# Altium schematic symbol library jlcpcb_2025_04_capacitors_extended_0402.schlib: 3594 symbols (part 3 of 20)
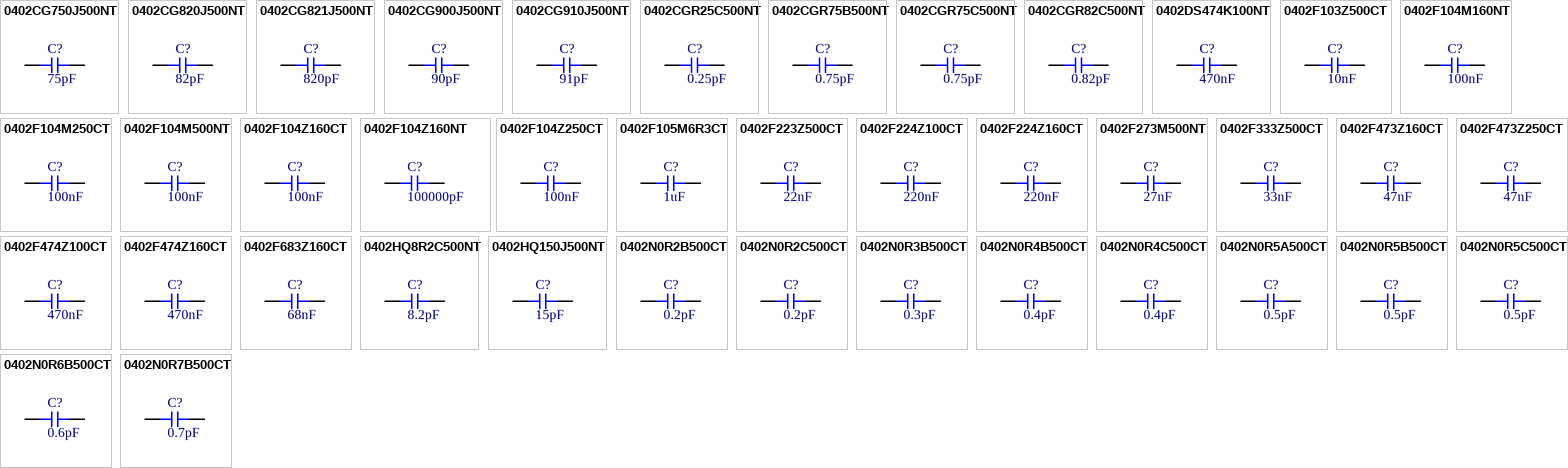
[diagram p91: symbols 0402CG750J500NT to 0402N0R7B500CT]

## 0402N0R6B500CT
designator C?  Capacitance: 0.6pF  (hidden comment: *)
Capacitor, Ceramic (MLCC), 0.6pF, 50V, NP0, SMD 0402; Manufacturer: Walsin Tech Corp; Manufacturer Part Number: 0402N0R6B500CT; Package Size: 0402; JLCPCB Basic Part: No; JLCPCB Part Number: C555387; Supplier 1: LCSC; Category: Capacitors - MLCC; Supplier Part Number 1: C555387; Voltage Rating: 50V; Temperature Coefficient: NP0; RoHS: Yes; ComponentLink1Description: Datasheet; ComponentLink1URL: https://wmsc.lcsc.com/wmsc/upload/file/pdf/v2/lcsc/2304140030_Walsin-Tech-Corp-0402N0R6B500CT_C555387.pdf; ComponentLink2Description: JLCPCB Part URL; ComponentLink2URL: https://jlcpcb.com/partdetail/C555387; ComponentLink3Description: LCSC Part URL; ComponentLink3URL: https://lcsc.com/product-detail/Multilayer-Ceramic-Capacitors-MLCC---SMD-SMT_Walsin-Tech-Corp-Walsin-Tech-Corp-0402N0R6B500CT_C555387.html
footprint CAP-0402 (0402 (1005M) Capacitor)
pins: 1, 2

## 0402N0R7B500CT
designator C?  Capacitance: 0.7pF  (hidden comment: *)
Capacitor, Ceramic (MLCC), 0.7pF, 50V, NP0, SMD 0402; Manufacturer: Walsin Tech Corp; Manufacturer Part Number: 0402N0R7B500CT; Package Size: 0402; JLCPCB Basic Part: No; JLCPCB Part Number: C2894185; Supplier 1: LCSC; Category: Capacitors - MLCC; Supplier Part Number 1: C2894185; Voltage Rating: 50V; Temperature Coefficient: NP0; RoHS: Yes; ComponentLink1Description: Datasheet; ComponentLink1URL: https://wmsc.lcsc.com/wmsc/upload/file/pdf/v2/lcsc/2109081830_Walsin-Tech-Corp-0402N0R7B500CT_C2894185.pdf; ComponentLink2Description: JLCPCB Part URL; ComponentLink2URL: https://jlcpcb.com/partdetail/C2894185; ComponentLink3Description: LCSC Part URL; ComponentLink3URL: https://lcsc.com/product-detail/Multilayer-Ceramic-Capacitors-MLCC---SMD-SMT_Walsin-Tech-Corp-Walsin-Tech-Corp-0402N0R7B500CT_C2894185.html
footprint CAP-0402 (0402 (1005M) Capacitor)
pins: 1, 2

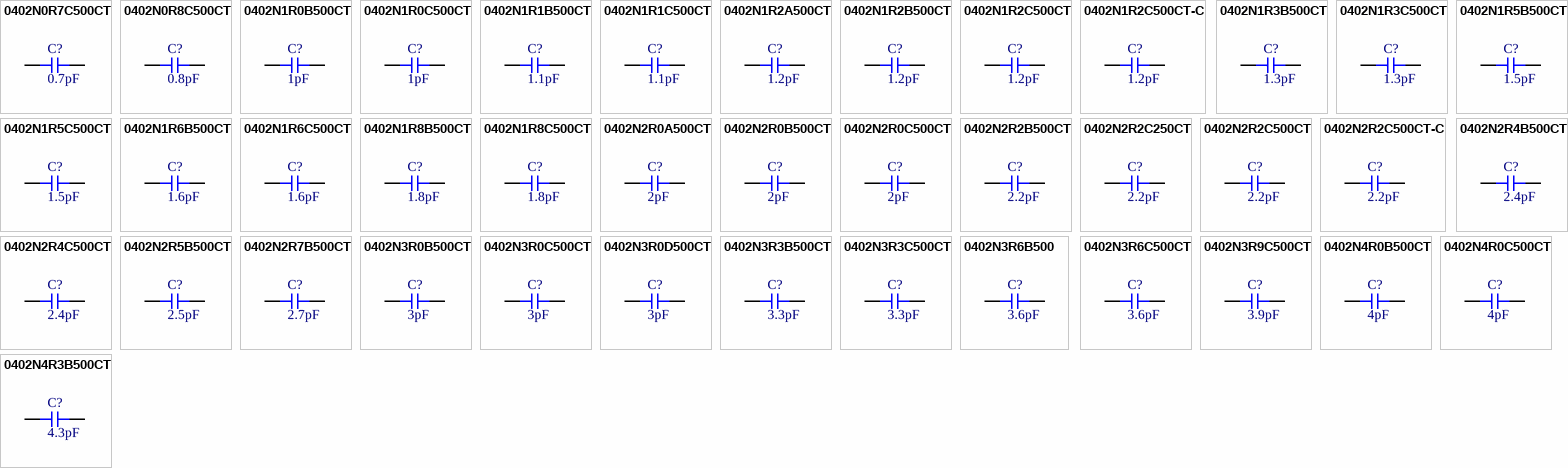
[diagram p9: symbols 0402N0R7C500CT to 0402N4R3B500CT]

## 0402N0R7C500CT
designator C?  Capacitance: 0.7pF  (hidden comment: *)
Capacitor, Ceramic (MLCC), 0.7pF, 50V, NP0, SMD 0402; Manufacturer: Walsin Tech Corp; Manufacturer Part Number: 0402N0R7C500CT; Package Size: 0402; JLCPCB Basic Part: No; JLCPCB Part Number: C2909410; Supplier 1: LCSC; Category: Capacitors - MLCC; Supplier Part Number 1: C2909410; Voltage Rating: 50V; Temperature Coefficient: NP0; RoHS: Yes; ComponentLink1Description: Datasheet; ComponentLink1URL: https://wmsc.lcsc.com/wmsc/upload/file/pdf/v2/lcsc/2110272130_Walsin-Tech-Corp-0402N0R7C500CT_C2909410.pdf; ComponentLink2Description: JLCPCB Part URL; ComponentLink2URL: https://jlcpcb.com/partdetail/C2909410; ComponentLink3Description: LCSC Part URL; ComponentLink3URL: https://lcsc.com/product-detail/Multilayer-Ceramic-Capacitors-MLCC---SMD-SMT_Walsin-Tech-Corp-Walsin-Tech-Corp-0402N0R7C500CT_C2909410.html
footprint CAP-0402 (0402 (1005M) Capacitor)
pins: 1, 2

## 0402N0R8C500CT
designator C?  Capacitance: 0.8pF  (hidden comment: *)
Capacitor, Ceramic (MLCC), 0.8pF, 50V, NP0, SMD 0402; Manufacturer: Walsin Tech Corp; Manufacturer Part Number: 0402N0R8C500CT; Package Size: 0402; JLCPCB Basic Part: No; JLCPCB Part Number: C387965; Supplier 1: LCSC; Category: Capacitors - MLCC; Supplier Part Number 1: C387965; Voltage Rating: 50V; Temperature Coefficient: NP0; RoHS: Yes; ComponentLink1Description: Datasheet; ComponentLink1URL: https://wmsc.lcsc.com/wmsc/upload/file/pdf/v2/lcsc/2304140030_Walsin-Tech-Corp-0402N0R8C500CT_C387965.pdf; ComponentLink2Description: JLCPCB Part URL; ComponentLink2URL: https://jlcpcb.com/partdetail/C387965; ComponentLink3Description: LCSC Part URL; ComponentLink3URL: https://lcsc.com/product-detail/Multilayer-Ceramic-Capacitors-MLCC---SMD-SMT_Walsin-Tech-Corp-Walsin-Tech-Corp-0402N0R8C500CT_C387965.html
footprint CAP-0402 (0402 (1005M) Capacitor)
pins: 1, 2

## 0402N1R0B500CT
designator C?  Capacitance: 1pF  (hidden comment: *)
Capacitor, Ceramic (MLCC), 1pF, 50V, NP0, SMD 0402; Manufacturer: Walsin Tech Corp; Manufacturer Part Number: 0402N1R0B500CT; Package Size: 0402; JLCPCB Basic Part: No; JLCPCB Part Number: C301966; Supplier 1: LCSC; Category: Capacitors - MLCC; Supplier Part Number 1: C301966; Voltage Rating: 50V; Temperature Coefficient: NP0; RoHS: Yes; ComponentLink1Description: Datasheet; ComponentLink1URL: https://wmsc.lcsc.com/wmsc/upload/file/pdf/v2/lcsc/2304140030_Walsin-Tech-Corp-0402N1R0B500CT_C301966.pdf; ComponentLink2Description: JLCPCB Part URL; ComponentLink2URL: https://jlcpcb.com/partdetail/C301966; ComponentLink3Description: LCSC Part URL; ComponentLink3URL: https://lcsc.com/product-detail/Multilayer-Ceramic-Capacitors-MLCC---SMD-SMT_Walsin-Tech-Corp-Walsin-Tech-Corp-0402N1R0B500CT_C301966.html
footprint CAP-0402 (0402 (1005M) Capacitor)
pins: 1, 2

## 0402N1R0C500CT
designator C?  Capacitance: 1pF  (hidden comment: *)
Capacitor, Ceramic (MLCC), 1pF, 50V, NP0, SMD 0402; Manufacturer: Walsin Tech Corp; Manufacturer Part Number: 0402N1R0C500CT; Package Size: 0402; JLCPCB Basic Part: No; JLCPCB Part Number: C123461; Supplier 1: LCSC; Category: Capacitors - MLCC; Supplier Part Number 1: C123461; Voltage Rating: 50V; Temperature Coefficient: NP0; RoHS: Yes; ComponentLink1Description: Datasheet; ComponentLink1URL: https://wmsc.lcsc.com/wmsc/upload/file/pdf/v2/lcsc/2304140030_Walsin-Tech-Corp-0402N1R0C500CT_C123461.pdf; ComponentLink2Description: JLCPCB Part URL; ComponentLink2URL: https://jlcpcb.com/partdetail/C123461; ComponentLink3Description: LCSC Part URL; ComponentLink3URL: https://lcsc.com/product-detail/Multilayer-Ceramic-Capacitors-MLCC---SMD-SMT_Walsin-Tech-Corp-Walsin-Tech-Corp-0402N1R0C500CT_C123461.html
footprint CAP-0402 (0402 (1005M) Capacitor)
pins: 1, 2

## 0402N1R1B500CT
designator C?  Capacitance: 1.1pF  (hidden comment: *)
Capacitor, Ceramic (MLCC), 1.1pF, 50V, NP0, SMD 0402; Manufacturer: Walsin Tech Corp; Manufacturer Part Number: 0402N1R1B500CT; Package Size: 0402; JLCPCB Basic Part: No; JLCPCB Part Number: C2918539; Supplier 1: LCSC; Category: Capacitors - MLCC; Supplier Part Number 1: C2918539; Voltage Rating: 50V; Temperature Coefficient: NP0; RoHS: Yes; ComponentLink1Description: Datasheet; ComponentLink1URL: https://wmsc.lcsc.com/wmsc/upload/file/pdf/v2/lcsc/2111171830_Walsin-Tech-Corp-0402N1R1B500CT_C2918539.pdf; ComponentLink2Description: JLCPCB Part URL; ComponentLink2URL: https://jlcpcb.com/partdetail/C2918539; ComponentLink3Description: LCSC Part URL; ComponentLink3URL: https://lcsc.com/product-detail/Multilayer-Ceramic-Capacitors-MLCC---SMD-SMT_Walsin-Tech-Corp-Walsin-Tech-Corp-0402N1R1B500CT_C2918539.html
footprint CAP-0402 (0402 (1005M) Capacitor)
pins: 1, 2

## 0402N1R1C500CT
designator C?  Capacitance: 1.1pF  (hidden comment: *)
Capacitor, Ceramic (MLCC), 1.1pF, 50V, NP0, SMD 0402; Manufacturer: Walsin Tech Corp; Manufacturer Part Number: 0402N1R1C500CT; Package Size: 0402; JLCPCB Basic Part: No; JLCPCB Part Number: C387974; Supplier 1: LCSC; Category: Capacitors - MLCC; Supplier Part Number 1: C387974; Voltage Rating: 50V; Temperature Coefficient: NP0; RoHS: Yes; ComponentLink1Description: Datasheet; ComponentLink1URL: https://wmsc.lcsc.com/wmsc/upload/file/pdf/v2/lcsc/2304140030_Walsin-Tech-Corp-0402N1R1C500CT_C387974.pdf; ComponentLink2Description: JLCPCB Part URL; ComponentLink2URL: https://jlcpcb.com/partdetail/C387974; ComponentLink3Description: LCSC Part URL; ComponentLink3URL: https://lcsc.com/product-detail/Multilayer-Ceramic-Capacitors-MLCC---SMD-SMT_Walsin-Tech-Corp-Walsin-Tech-Corp-0402N1R1C500CT_C387974.html
footprint CAP-0402 (0402 (1005M) Capacitor)
pins: 1, 2

## 0402N1R2A500CT
designator C?  Capacitance: 1.2pF  (hidden comment: *)
Capacitor, Ceramic (MLCC), 1.2pF, 50V, NP0, SMD 0402; Manufacturer: Walsin Tech Corp; Manufacturer Part Number: 0402N1R2A500CT; Package Size: 0402; JLCPCB Basic Part: No; JLCPCB Part Number: C296011; Supplier 1: LCSC; Category: Capacitors - MLCC; Supplier Part Number 1: C296011; Voltage Rating: 50V; Temperature Coefficient: NP0; RoHS: Yes; ComponentLink1Description: Datasheet; ComponentLink1URL: https://wmsc.lcsc.com/wmsc/upload/file/pdf/v2/lcsc/2304140030_Walsin-Tech-Corp-0402N1R2A500CT_C296011.pdf; ComponentLink2Description: JLCPCB Part URL; ComponentLink2URL: https://jlcpcb.com/partdetail/C296011; ComponentLink3Description: LCSC Part URL; ComponentLink3URL: https://lcsc.com/product-detail/Multilayer-Ceramic-Capacitors-MLCC---SMD-SMT_Walsin-Tech-Corp-Walsin-Tech-Corp-0402N1R2A500CT_C296011.html
footprint CAP-0402 (0402 (1005M) Capacitor)
pins: 1, 2

## 0402N1R2B500CT
designator C?  Capacitance: 1.2pF  (hidden comment: *)
Capacitor, Ceramic (MLCC), 1.2pF, 50V, NP0, SMD 0402; Manufacturer: Walsin Tech Corp; Manufacturer Part Number: 0402N1R2B500CT; Package Size: 0402; JLCPCB Basic Part: No; JLCPCB Part Number: C575464; Supplier 1: LCSC; Category: Capacitors - MLCC; Supplier Part Number 1: C575464; Voltage Rating: 50V; Temperature Coefficient: NP0; RoHS: Yes; ComponentLink1Description: Datasheet; ComponentLink1URL: https://wmsc.lcsc.com/wmsc/upload/file/pdf/v2/lcsc/2304140030_Walsin-Tech-Corp-0402N1R2B500CT_C575464.pdf; ComponentLink2Description: JLCPCB Part URL; ComponentLink2URL: https://jlcpcb.com/partdetail/C575464; ComponentLink3Description: LCSC Part URL; ComponentLink3URL: https://lcsc.com/product-detail/Multilayer-Ceramic-Capacitors-MLCC---SMD-SMT_Walsin-Tech-Corp-Walsin-Tech-Corp-0402N1R2B500CT_C575464.html
footprint CAP-0402 (0402 (1005M) Capacitor)
pins: 1, 2

## 0402N1R2C500CT
designator C?  Capacitance: 1.2pF  (hidden comment: *)
Capacitor, Ceramic (MLCC), 1.2pF, 50V, NP0, SMD 0402; Manufacturer: Walsin Tech Corp; Manufacturer Part Number: 0402N1R2C500CT; Package Size: 0402; JLCPCB Basic Part: No; JLCPCB Part Number: C301969; Supplier 1: LCSC; Category: Capacitors - MLCC; Supplier Part Number 1: C301969; Voltage Rating: 50V; Temperature Coefficient: NP0; RoHS: Yes; ComponentLink1Description: Datasheet; ComponentLink1URL: https://wmsc.lcsc.com/wmsc/upload/file/pdf/v2/lcsc/2304140030_Walsin-Tech-Corp-0402N1R2C500CT_C301969.pdf; ComponentLink2Description: JLCPCB Part URL; ComponentLink2URL: https://jlcpcb.com/partdetail/C301969; ComponentLink3Description: LCSC Part URL; ComponentLink3URL: https://lcsc.com/product-detail/Multilayer-Ceramic-Capacitors-MLCC---SMD-SMT_Walsin-Tech-Corp-Walsin-Tech-Corp-0402N1R2C500CT_C301969.html
footprint CAP-0402 (0402 (1005M) Capacitor)
pins: 1, 2

## 0402N1R2C500CT-C
designator C?  Capacitance: 1.2pF  (hidden comment: *)
Capacitor, Ceramic (MLCC), 1.2pF, 50V, NP0, SMD 0402; Manufacturer: Walsin Tech Corp; Manufacturer Part Number: 0402N1R2C500CT-C; Package Size: 0402; JLCPCB Basic Part: No; JLCPCB Part Number: C2991508; Supplier 1: LCSC; Category: Capacitors - MLCC; Supplier Part Number 1: C2991508; Voltage Rating: 50V; Temperature Coefficient: NP0; RoHS: Yes; ComponentLink1Description: Datasheet; ComponentLink1URL: https://wmsc.lcsc.com/wmsc/upload/file/pdf/v2/lcsc/2204131745_Walsin-Tech-Corp-0402N1R2C500CT-C_C2991508.pdf; ComponentLink2Description: JLCPCB Part URL; ComponentLink2URL: https://jlcpcb.com/partdetail/C2991508; ComponentLink3Description: LCSC Part URL; ComponentLink3URL: https://lcsc.com/product-detail/Multilayer-Ceramic-Capacitors-MLCC---SMD-SMT_Walsin-Tech-Corp-Walsin-Tech-Corp-0402N1R2C500CT-C_C2991508.html
footprint CAP-0402 (0402 (1005M) Capacitor)
pins: 1, 2

## 0402N1R3B500CT
designator C?  Capacitance: 1.3pF  (hidden comment: *)
Capacitor, Ceramic (MLCC), 1.3pF, 50V, NP0, SMD 0402; Manufacturer: Walsin Tech Corp; Manufacturer Part Number: 0402N1R3B500CT; Package Size: 0402; JLCPCB Basic Part: No; JLCPCB Part Number: C880811; Supplier 1: LCSC; Category: Capacitors - MLCC; Supplier Part Number 1: C880811; Voltage Rating: 50V; Temperature Coefficient: NP0; RoHS: Yes; ComponentLink1Description: Datasheet; ComponentLink1URL: https://wmsc.lcsc.com/wmsc/upload/file/pdf/v2/lcsc/2304140030_Walsin-Tech-Corp-0402N1R3B500CT_C880811.pdf; ComponentLink2Description: JLCPCB Part URL; ComponentLink2URL: https://jlcpcb.com/partdetail/C880811; ComponentLink3Description: LCSC Part URL; ComponentLink3URL: https://lcsc.com/product-detail/Multilayer-Ceramic-Capacitors-MLCC---SMD-SMT_Walsin-Tech-Corp-Walsin-Tech-Corp-0402N1R3B500CT_C880811.html
footprint CAP-0402 (0402 (1005M) Capacitor)
pins: 1, 2

## 0402N1R3C500CT
designator C?  Capacitance: 1.3pF  (hidden comment: *)
Capacitor, Ceramic (MLCC), 1.3pF, 50V, NP0, SMD 0402; Manufacturer: Walsin Tech Corp; Manufacturer Part Number: 0402N1R3C500CT; Package Size: 0402; JLCPCB Basic Part: No; JLCPCB Part Number: C555394; Supplier 1: LCSC; Category: Capacitors - MLCC; Supplier Part Number 1: C555394; Voltage Rating: 50V; Temperature Coefficient: NP0; RoHS: Yes; ComponentLink1Description: Datasheet; ComponentLink1URL: https://wmsc.lcsc.com/wmsc/upload/file/pdf/v2/lcsc/2304140030_Walsin-Tech-Corp-0402N1R3C500CT_C555394.pdf; ComponentLink2Description: JLCPCB Part URL; ComponentLink2URL: https://jlcpcb.com/partdetail/C555394; ComponentLink3Description: LCSC Part URL; ComponentLink3URL: https://lcsc.com/product-detail/Multilayer-Ceramic-Capacitors-MLCC---SMD-SMT_Walsin-Tech-Corp-Walsin-Tech-Corp-0402N1R3C500CT_C555394.html
footprint CAP-0402 (0402 (1005M) Capacitor)
pins: 1, 2

## 0402N1R5B500CT
designator C?  Capacitance: 1.5pF  (hidden comment: *)
Capacitor, Ceramic (MLCC), 1.5pF, 50V, NP0, SMD 0402; Manufacturer: Walsin Tech Corp; Manufacturer Part Number: 0402N1R5B500CT; Package Size: 0402; JLCPCB Basic Part: No; JLCPCB Part Number: C525495; Supplier 1: LCSC; Category: Capacitors - MLCC; Supplier Part Number 1: C525495; Voltage Rating: 50V; Temperature Coefficient: NP0; RoHS: Yes; ComponentLink1Description: Datasheet; ComponentLink1URL: https://wmsc.lcsc.com/wmsc/upload/file/pdf/v2/lcsc/2304140030_Walsin-Tech-Corp-0402N1R5B500CT_C525495.pdf; ComponentLink2Description: JLCPCB Part URL; ComponentLink2URL: https://jlcpcb.com/partdetail/C525495; ComponentLink3Description: LCSC Part URL; ComponentLink3URL: https://lcsc.com/product-detail/Multilayer-Ceramic-Capacitors-MLCC---SMD-SMT_Walsin-Tech-Corp-Walsin-Tech-Corp-0402N1R5B500CT_C525495.html
footprint CAP-0402 (0402 (1005M) Capacitor)
pins: 1, 2

## 0402N1R5C500CT
designator C?  Capacitance: 1.5pF  (hidden comment: *)
Capacitor, Ceramic (MLCC), 1.5pF, 50V, NP0, SMD 0402; Manufacturer: Walsin Tech Corp; Manufacturer Part Number: 0402N1R5C500CT; Package Size: 0402; JLCPCB Basic Part: No; JLCPCB Part Number: C387975; Supplier 1: LCSC; Category: Capacitors - MLCC; Supplier Part Number 1: C387975; Voltage Rating: 50V; Temperature Coefficient: NP0; RoHS: Yes; ComponentLink1Description: Datasheet; ComponentLink1URL: https://wmsc.lcsc.com/wmsc/upload/file/pdf/v2/lcsc/2304140030_Walsin-Tech-Corp-0402N1R5C500CT_C387975.pdf; ComponentLink2Description: JLCPCB Part URL; ComponentLink2URL: https://jlcpcb.com/partdetail/C387975; ComponentLink3Description: LCSC Part URL; ComponentLink3URL: https://lcsc.com/product-detail/Multilayer-Ceramic-Capacitors-MLCC---SMD-SMT_Walsin-Tech-Corp-Walsin-Tech-Corp-0402N1R5C500CT_C387975.html
footprint CAP-0402 (0402 (1005M) Capacitor)
pins: 1, 2

## 0402N1R6B500CT
designator C?  Capacitance: 1.6pF  (hidden comment: *)
Capacitor, Ceramic (MLCC), 1.6pF, 50V, NP0, SMD 0402; Manufacturer: Walsin Tech Corp; Manufacturer Part Number: 0402N1R6B500CT; Package Size: 0402; JLCPCB Basic Part: No; JLCPCB Part Number: C2918575; Supplier 1: LCSC; Category: Capacitors - MLCC; Supplier Part Number 1: C2918575; Voltage Rating: 50V; Temperature Coefficient: NP0; RoHS: Yes; ComponentLink1Description: Datasheet; ComponentLink1URL: https://wmsc.lcsc.com/wmsc/upload/file/pdf/v2/lcsc/2111171830_Walsin-Tech-Corp-0402N1R6B500CT_C2918575.pdf; ComponentLink2Description: JLCPCB Part URL; ComponentLink2URL: https://jlcpcb.com/partdetail/C2918575; ComponentLink3Description: LCSC Part URL; ComponentLink3URL: https://lcsc.com/product-detail/Multilayer-Ceramic-Capacitors-MLCC---SMD-SMT_Walsin-Tech-Corp-Walsin-Tech-Corp-0402N1R6B500CT_C2918575.html
footprint CAP-0402 (0402 (1005M) Capacitor)
pins: 1, 2

## 0402N1R6C500CT
designator C?  Capacitance: 1.6pF  (hidden comment: *)
Capacitor, Ceramic (MLCC), 1.6pF, 50V, NP0, SMD 0402; Manufacturer: Walsin Tech Corp; Manufacturer Part Number: 0402N1R6C500CT; Package Size: 0402; JLCPCB Basic Part: No; JLCPCB Part Number: C555382; Supplier 1: LCSC; Category: Capacitors - MLCC; Supplier Part Number 1: C555382; Voltage Rating: 50V; Temperature Coefficient: NP0; RoHS: Yes; ComponentLink1Description: Datasheet; ComponentLink1URL: https://wmsc.lcsc.com/wmsc/upload/file/pdf/v2/lcsc/2304140030_Walsin-Tech-Corp-0402N1R6C500CT_C555382.pdf; ComponentLink2Description: JLCPCB Part URL; ComponentLink2URL: https://jlcpcb.com/partdetail/C555382; ComponentLink3Description: LCSC Part URL; ComponentLink3URL: https://lcsc.com/product-detail/Multilayer-Ceramic-Capacitors-MLCC---SMD-SMT_Walsin-Tech-Corp-Walsin-Tech-Corp-0402N1R6C500CT_C555382.html
footprint CAP-0402 (0402 (1005M) Capacitor)
pins: 1, 2

## 0402N1R8B500CT
designator C?  Capacitance: 1.8pF  (hidden comment: *)
Capacitor, Ceramic (MLCC), 1.8pF, 50V, NP0, SMD 0402; Manufacturer: Walsin Tech Corp; Manufacturer Part Number: 0402N1R8B500CT; Package Size: 0402; JLCPCB Basic Part: No; JLCPCB Part Number: C387976; Supplier 1: LCSC; Category: Capacitors - MLCC; Supplier Part Number 1: C387976; Voltage Rating: 50V; Temperature Coefficient: NP0; RoHS: Yes; ComponentLink1Description: Datasheet; ComponentLink1URL: https://wmsc.lcsc.com/wmsc/upload/file/pdf/v2/lcsc/2304140030_Walsin-Tech-Corp-0402N1R8B500CT_C387976.pdf; ComponentLink2Description: JLCPCB Part URL; ComponentLink2URL: https://jlcpcb.com/partdetail/C387976; ComponentLink3Description: LCSC Part URL; ComponentLink3URL: https://lcsc.com/product-detail/Multilayer-Ceramic-Capacitors-MLCC---SMD-SMT_Walsin-Tech-Corp-Walsin-Tech-Corp-0402N1R8B500CT_C387976.html
footprint CAP-0402 (0402 (1005M) Capacitor)
pins: 1, 2

## 0402N1R8C500CT
designator C?  Capacitance: 1.8pF  (hidden comment: *)
Capacitor, Ceramic (MLCC), 1.8pF, 50V, NP0, SMD 0402; Manufacturer: Walsin Tech Corp; Manufacturer Part Number: 0402N1R8C500CT; Package Size: 0402; JLCPCB Basic Part: No; JLCPCB Part Number: C301970; Supplier 1: LCSC; Category: Capacitors - MLCC; Supplier Part Number 1: C301970; Voltage Rating: 50V; Temperature Coefficient: NP0; RoHS: Yes; ComponentLink1Description: Datasheet; ComponentLink1URL: https://wmsc.lcsc.com/wmsc/upload/file/pdf/v2/lcsc/2304140030_Walsin-Tech-Corp-0402N1R8C500CT_C301970.pdf; ComponentLink2Description: JLCPCB Part URL; ComponentLink2URL: https://jlcpcb.com/partdetail/C301970; ComponentLink3Description: LCSC Part URL; ComponentLink3URL: https://lcsc.com/product-detail/Multilayer-Ceramic-Capacitors-MLCC---SMD-SMT_Walsin-Tech-Corp-Walsin-Tech-Corp-0402N1R8C500CT_C301970.html
footprint CAP-0402 (0402 (1005M) Capacitor)
pins: 1, 2

## 0402N2R0A500CT
designator C?  Capacitance: 2pF  (hidden comment: *)
Capacitor, Ceramic (MLCC), 2pF, 50V, NP0, SMD 0402; Manufacturer: Walsin Tech Corp; Manufacturer Part Number: 0402N2R0A500CT; Package Size: 0402; JLCPCB Basic Part: No; JLCPCB Part Number: C301976; Supplier 1: LCSC; Category: Capacitors - MLCC; Supplier Part Number 1: C301976; Voltage Rating: 50V; Temperature Coefficient: NP0; RoHS: Yes; ComponentLink1Description: Datasheet; ComponentLink1URL: https://wmsc.lcsc.com/wmsc/upload/file/pdf/v2/lcsc/2304140030_Walsin-Tech-Corp-0402N2R0A500CT_C301976.pdf; ComponentLink2Description: JLCPCB Part URL; ComponentLink2URL: https://jlcpcb.com/partdetail/C301976; ComponentLink3Description: LCSC Part URL; ComponentLink3URL: https://lcsc.com/product-detail/Multilayer-Ceramic-Capacitors-MLCC---SMD-SMT_Walsin-Tech-Corp-Walsin-Tech-Corp-0402N2R0A500CT_C301976.html
footprint CAP-0402 (0402 (1005M) Capacitor)
pins: 1, 2

## 0402N2R0B500CT
designator C?  Capacitance: 2pF  (hidden comment: *)
Capacitor, Ceramic (MLCC), 2pF, 50V, NP0, SMD 0402; Manufacturer: Walsin Tech Corp; Manufacturer Part Number: 0402N2R0B500CT; Package Size: 0402; JLCPCB Basic Part: No; JLCPCB Part Number: C314289; Supplier 1: LCSC; Category: Capacitors - MLCC; Supplier Part Number 1: C314289; Voltage Rating: 50V; Temperature Coefficient: NP0; RoHS: Yes; ComponentLink1Description: Datasheet; ComponentLink1URL: https://wmsc.lcsc.com/wmsc/upload/file/pdf/v2/lcsc/2304140030_Walsin-Tech-Corp-0402N2R0B500CT_C314289.pdf; ComponentLink2Description: JLCPCB Part URL; ComponentLink2URL: https://jlcpcb.com/partdetail/C314289; ComponentLink3Description: LCSC Part URL; ComponentLink3URL: https://lcsc.com/product-detail/Multilayer-Ceramic-Capacitors-MLCC---SMD-SMT_Walsin-Tech-Corp-Walsin-Tech-Corp-0402N2R0B500CT_C314289.html
footprint CAP-0402 (0402 (1005M) Capacitor)
pins: 1, 2

## 0402N2R0C500CT
designator C?  Capacitance: 2pF  (hidden comment: *)
Capacitor, Ceramic (MLCC), 2pF, 50V, NP0, SMD 0402; Manufacturer: Walsin Tech Corp; Manufacturer Part Number: 0402N2R0C500CT; Package Size: 0402; JLCPCB Basic Part: No; JLCPCB Part Number: C295975; Supplier 1: LCSC; Category: Capacitors - MLCC; Supplier Part Number 1: C295975; Voltage Rating: 50V; Temperature Coefficient: NP0; RoHS: Yes; ComponentLink1Description: Datasheet; ComponentLink1URL: https://wmsc.lcsc.com/wmsc/upload/file/pdf/v2/lcsc/2304140030_Walsin-Tech-Corp-0402N2R0C500CT_C295975.pdf; ComponentLink2Description: JLCPCB Part URL; ComponentLink2URL: https://jlcpcb.com/partdetail/C295975; ComponentLink3Description: LCSC Part URL; ComponentLink3URL: https://lcsc.com/product-detail/Multilayer-Ceramic-Capacitors-MLCC---SMD-SMT_Walsin-Tech-Corp-Walsin-Tech-Corp-0402N2R0C500CT_C295975.html
footprint CAP-0402 (0402 (1005M) Capacitor)
pins: 1, 2

## 0402N2R2B500CT
designator C?  Capacitance: 2.2pF  (hidden comment: *)
Capacitor, Ceramic (MLCC), 2.2pF, 50V, NP0, SMD 0402; Manufacturer: Walsin Tech Corp; Manufacturer Part Number: 0402N2R2B500CT; Package Size: 0402; JLCPCB Basic Part: No; JLCPCB Part Number: C123473; Supplier 1: LCSC; Category: Capacitors - MLCC; Supplier Part Number 1: C123473; Voltage Rating: 50V; Temperature Coefficient: NP0; RoHS: Yes; ComponentLink1Description: Datasheet; ComponentLink1URL: https://wmsc.lcsc.com/wmsc/upload/file/pdf/v2/lcsc/2304140030_Walsin-Tech-Corp-0402N2R2B500CT_C123473.pdf; ComponentLink2Description: JLCPCB Part URL; ComponentLink2URL: https://jlcpcb.com/partdetail/C123473; ComponentLink3Description: LCSC Part URL; ComponentLink3URL: https://lcsc.com/product-detail/Multilayer-Ceramic-Capacitors-MLCC---SMD-SMT_Walsin-Tech-Corp-Walsin-Tech-Corp-0402N2R2B500CT_C123473.html
footprint CAP-0402 (0402 (1005M) Capacitor)
pins: 1, 2

## 0402N2R2C250CT
designator C?  Capacitance: 2.2pF  (hidden comment: *)
Capacitor, Ceramic (MLCC), 2.2pF, 25V, C0G, SMD 0402; Manufacturer: Walsin Tech Corp; Manufacturer Part Number: 0402N2R2C250CT; Package Size: 0402; JLCPCB Basic Part: No; JLCPCB Part Number: C3845891; Supplier 1: LCSC; Category: Capacitors - MLCC; Supplier Part Number 1: C3845891; Voltage Rating: 25V; Temperature Coefficient: C0G; RoHS: Yes; ComponentLink1Description: Datasheet; ComponentLink1URL: https://wmsc.lcsc.com/wmsc/upload/file/pdf/v2/lcsc/2309201534_Walsin-Tech-Corp-0402N2R2C250CT_C3845891.pdf; ComponentLink2Description: JLCPCB Part URL; ComponentLink2URL: https://jlcpcb.com/partdetail/C3845891; ComponentLink3Description: LCSC Part URL; ComponentLink3URL: https://lcsc.com/product-detail/Multilayer-Ceramic-Capacitors-MLCC---SMD-SMT_Walsin-Tech-Corp-Walsin-Tech-Corp-0402N2R2C250CT_C3845891.html
footprint CAP-0402 (0402 (1005M) Capacitor)
pins: 1, 2

## 0402N2R2C500CT
designator C?  Capacitance: 2.2pF  (hidden comment: *)
Capacitor, Ceramic (MLCC), 2.2pF, 50V, NP0, SMD 0402; Manufacturer: Walsin Tech Corp; Manufacturer Part Number: 0402N2R2C500CT; Package Size: 0402; JLCPCB Basic Part: No; JLCPCB Part Number: C338141; Supplier 1: LCSC; Category: Capacitors - MLCC; Supplier Part Number 1: C338141; Voltage Rating: 50V; Temperature Coefficient: NP0; RoHS: Yes; ComponentLink1Description: Datasheet; ComponentLink1URL: https://wmsc.lcsc.com/wmsc/upload/file/pdf/v2/lcsc/2304140030_Walsin-Tech-Corp-0402N2R2C500CT_C338141.pdf; ComponentLink2Description: JLCPCB Part URL; ComponentLink2URL: https://jlcpcb.com/partdetail/C338141; ComponentLink3Description: LCSC Part URL; ComponentLink3URL: https://lcsc.com/product-detail/Multilayer-Ceramic-Capacitors-MLCC---SMD-SMT_Walsin-Tech-Corp-Walsin-Tech-Corp-0402N2R2C500CT_C338141.html
footprint CAP-0402 (0402 (1005M) Capacitor)
pins: 1, 2

## 0402N2R2C500CT-C
designator C?  Capacitance: 2.2pF  (hidden comment: *)
Capacitor, Ceramic (MLCC), 2.2pF, 50V, NP0, SMD 0402; Manufacturer: Walsin Tech Corp; Manufacturer Part Number: 0402N2R2C500CT-C; Package Size: 0402; JLCPCB Basic Part: No; JLCPCB Part Number: C2991379; Supplier 1: LCSC; Category: Capacitors - MLCC; Supplier Part Number 1: C2991379; Voltage Rating: 50V; Temperature Coefficient: NP0; RoHS: Yes; ComponentLink1Description: Datasheet; ComponentLink1URL: https://wmsc.lcsc.com/wmsc/upload/file/pdf/v2/lcsc/2204131745_Walsin-Tech-Corp-0402N2R2C500CT-C_C2991379.pdf; ComponentLink2Description: JLCPCB Part URL; ComponentLink2URL: https://jlcpcb.com/partdetail/C2991379; ComponentLink3Description: LCSC Part URL; ComponentLink3URL: https://lcsc.com/product-detail/Multilayer-Ceramic-Capacitors-MLCC---SMD-SMT_Walsin-Tech-Corp-Walsin-Tech-Corp-0402N2R2C500CT-C_C2991379.html
footprint CAP-0402 (0402 (1005M) Capacitor)
pins: 1, 2

## 0402N2R4B500CT
designator C?  Capacitance: 2.4pF  (hidden comment: *)
Capacitor, Ceramic (MLCC), 2.4pF, 50V, NP0, SMD 0402; Manufacturer: Walsin Tech Corp; Manufacturer Part Number: 0402N2R4B500CT; Package Size: 0402; JLCPCB Basic Part: No; JLCPCB Part Number: C123475; Supplier 1: LCSC; Category: Capacitors - MLCC; Supplier Part Number 1: C123475; Voltage Rating: 50V; Temperature Coefficient: NP0; RoHS: Yes; ComponentLink1Description: Datasheet; ComponentLink1URL: https://wmsc.lcsc.com/wmsc/upload/file/pdf/v2/lcsc/2304140030_Walsin-Tech-Corp-0402N2R4B500CT_C123475.pdf; ComponentLink2Description: JLCPCB Part URL; ComponentLink2URL: https://jlcpcb.com/partdetail/C123475; ComponentLink3Description: LCSC Part URL; ComponentLink3URL: https://lcsc.com/product-detail/Multilayer-Ceramic-Capacitors-MLCC---SMD-SMT_Walsin-Tech-Corp-Walsin-Tech-Corp-0402N2R4B500CT_C123475.html
footprint CAP-0402 (0402 (1005M) Capacitor)
pins: 1, 2

## 0402N2R4C500CT
designator C?  Capacitance: 2.4pF  (hidden comment: *)
Capacitor, Ceramic (MLCC), 2.4pF, 50V, NP0, SMD 0402; Manufacturer: Walsin Tech Corp; Manufacturer Part Number: 0402N2R4C500CT; Package Size: 0402; JLCPCB Basic Part: No; JLCPCB Part Number: C123476; Supplier 1: LCSC; Category: Capacitors - MLCC; Supplier Part Number 1: C123476; Voltage Rating: 50V; Temperature Coefficient: NP0; RoHS: Yes; ComponentLink1Description: Datasheet; ComponentLink1URL: https://wmsc.lcsc.com/wmsc/upload/file/pdf/v2/lcsc/2304140030_Walsin-Tech-Corp-0402N2R4C500CT_C123476.pdf; ComponentLink2Description: JLCPCB Part URL; ComponentLink2URL: https://jlcpcb.com/partdetail/C123476; ComponentLink3Description: LCSC Part URL; ComponentLink3URL: https://lcsc.com/product-detail/Multilayer-Ceramic-Capacitors-MLCC---SMD-SMT_Walsin-Tech-Corp-Walsin-Tech-Corp-0402N2R4C500CT_C123476.html
footprint CAP-0402 (0402 (1005M) Capacitor)
pins: 1, 2

## 0402N2R5B500CT
designator C?  Capacitance: 2.5pF  (hidden comment: *)
Capacitor, Ceramic (MLCC), 2.5pF, 50V, NP0, SMD 0402; Manufacturer: Walsin Tech Corp; Manufacturer Part Number: 0402N2R5B500CT; Package Size: 0402; JLCPCB Basic Part: No; JLCPCB Part Number: C458860; Supplier 1: LCSC; Category: Capacitors - MLCC; Supplier Part Number 1: C458860; Voltage Rating: 50V; Temperature Coefficient: NP0; RoHS: Yes; ComponentLink1Description: Datasheet; ComponentLink1URL: https://wmsc.lcsc.com/wmsc/upload/file/pdf/v2/lcsc/2304140030_Walsin-Tech-Corp-0402N2R5B500CT_C458860.pdf; ComponentLink2Description: JLCPCB Part URL; ComponentLink2URL: https://jlcpcb.com/partdetail/C458860; ComponentLink3Description: LCSC Part URL; ComponentLink3URL: https://lcsc.com/product-detail/Multilayer-Ceramic-Capacitors-MLCC---SMD-SMT_Walsin-Tech-Corp-Walsin-Tech-Corp-0402N2R5B500CT_C458860.html
footprint CAP-0402 (0402 (1005M) Capacitor)
pins: 1, 2

## 0402N2R7B500CT
designator C?  Capacitance: 2.7pF  (hidden comment: *)
Capacitor, Ceramic (MLCC), 2.7pF, 50V, NP0, SMD 0402; Manufacturer: Walsin Tech Corp; Manufacturer Part Number: 0402N2R7B500CT; Package Size: 0402; JLCPCB Basic Part: No; JLCPCB Part Number: C555385; Supplier 1: LCSC; Category: Capacitors - MLCC; Supplier Part Number 1: C555385; Voltage Rating: 50V; Temperature Coefficient: NP0; RoHS: Yes; ComponentLink1Description: Datasheet; ComponentLink1URL: https://wmsc.lcsc.com/wmsc/upload/file/pdf/v2/lcsc/2304140030_Walsin-Tech-Corp-0402N2R7B500CT_C555385.pdf; ComponentLink2Description: JLCPCB Part URL; ComponentLink2URL: https://jlcpcb.com/partdetail/C555385; ComponentLink3Description: LCSC Part URL; ComponentLink3URL: https://lcsc.com/product-detail/Multilayer-Ceramic-Capacitors-MLCC---SMD-SMT_Walsin-Tech-Corp-Walsin-Tech-Corp-0402N2R7B500CT_C555385.html
footprint CAP-0402 (0402 (1005M) Capacitor)
pins: 1, 2

## 0402N3R0B500CT
designator C?  Capacitance: 3pF  (hidden comment: *)
Capacitor, Ceramic (MLCC), 3pF, 50V, NP0, SMD 0402; Manufacturer: Walsin Tech Corp; Manufacturer Part Number: 0402N3R0B500CT; Package Size: 0402; JLCPCB Basic Part: No; JLCPCB Part Number: C123481; Supplier 1: LCSC; Category: Capacitors - MLCC; Supplier Part Number 1: C123481; Voltage Rating: 50V; Temperature Coefficient: NP0; RoHS: Yes; ComponentLink1Description: Datasheet; ComponentLink1URL: https://wmsc.lcsc.com/wmsc/upload/file/pdf/v2/lcsc/2304140030_Walsin-Tech-Corp-0402N3R0B500CT_C123481.pdf; ComponentLink2Description: JLCPCB Part URL; ComponentLink2URL: https://jlcpcb.com/partdetail/C123481; ComponentLink3Description: LCSC Part URL; ComponentLink3URL: https://lcsc.com/product-detail/Multilayer-Ceramic-Capacitors-MLCC---SMD-SMT_Walsin-Tech-Corp-Walsin-Tech-Corp-0402N3R0B500CT_C123481.html
footprint CAP-0402 (0402 (1005M) Capacitor)
pins: 1, 2

## 0402N3R0C500CT
designator C?  Capacitance: 3pF  (hidden comment: *)
Capacitor, Ceramic (MLCC), 3pF, 50V, NP0, SMD 0402; Manufacturer: Walsin Tech Corp; Manufacturer Part Number: 0402N3R0C500CT; Package Size: 0402; JLCPCB Basic Part: No; JLCPCB Part Number: C123482; Supplier 1: LCSC; Category: Capacitors - MLCC; Supplier Part Number 1: C123482; Voltage Rating: 50V; Temperature Coefficient: NP0; RoHS: Yes; ComponentLink1Description: Datasheet; ComponentLink1URL: https://wmsc.lcsc.com/wmsc/upload/file/pdf/v2/lcsc/2304140030_Walsin-Tech-Corp-0402N3R0C500CT_C123482.pdf; ComponentLink2Description: JLCPCB Part URL; ComponentLink2URL: https://jlcpcb.com/partdetail/C123482; ComponentLink3Description: LCSC Part URL; ComponentLink3URL: https://lcsc.com/product-detail/Multilayer-Ceramic-Capacitors-MLCC---SMD-SMT_Walsin-Tech-Corp-Walsin-Tech-Corp-0402N3R0C500CT_C123482.html
footprint CAP-0402 (0402 (1005M) Capacitor)
pins: 1, 2

## 0402N3R0D500CT
designator C?  Capacitance: 3pF  (hidden comment: *)
Capacitor, Ceramic (MLCC), 3pF, 50V, NP0, SMD 0402; Manufacturer: Walsin Tech Corp; Manufacturer Part Number: 0402N3R0D500CT; Package Size: 0402; JLCPCB Basic Part: No; JLCPCB Part Number: C295981; Supplier 1: LCSC; Category: Capacitors - MLCC; Supplier Part Number 1: C295981; Voltage Rating: 50V; Temperature Coefficient: NP0; RoHS: Yes; ComponentLink1Description: Datasheet; ComponentLink1URL: https://wmsc.lcsc.com/wmsc/upload/file/pdf/v2/lcsc/2304140030_Walsin-Tech-Corp-0402N3R0D500CT_C295981.pdf; ComponentLink2Description: JLCPCB Part URL; ComponentLink2URL: https://jlcpcb.com/partdetail/C295981; ComponentLink3Description: LCSC Part URL; ComponentLink3URL: https://lcsc.com/product-detail/Multilayer-Ceramic-Capacitors-MLCC---SMD-SMT_Walsin-Tech-Corp-Walsin-Tech-Corp-0402N3R0D500CT_C295981.html
footprint CAP-0402 (0402 (1005M) Capacitor)
pins: 1, 2

## 0402N3R3B500CT
designator C?  Capacitance: 3.3pF  (hidden comment: *)
Capacitor, Ceramic (MLCC), 3.3pF, 50V, NP0, SMD 0402; Manufacturer: Walsin Tech Corp; Manufacturer Part Number: 0402N3R3B500CT; Package Size: 0402; JLCPCB Basic Part: No; JLCPCB Part Number: C123483; Supplier 1: LCSC; Category: Capacitors - MLCC; Supplier Part Number 1: C123483; Voltage Rating: 50V; Temperature Coefficient: NP0; RoHS: Yes; ComponentLink1Description: Datasheet; ComponentLink1URL: https://wmsc.lcsc.com/wmsc/upload/file/pdf/v2/lcsc/2304140030_Walsin-Tech-Corp-0402N3R3B500CT_C123483.pdf; ComponentLink2Description: JLCPCB Part URL; ComponentLink2URL: https://jlcpcb.com/partdetail/C123483; ComponentLink3Description: LCSC Part URL; ComponentLink3URL: https://lcsc.com/product-detail/Multilayer-Ceramic-Capacitors-MLCC---SMD-SMT_Walsin-Tech-Corp-Walsin-Tech-Corp-0402N3R3B500CT_C123483.html
footprint CAP-0402 (0402 (1005M) Capacitor)
pins: 1, 2

## 0402N3R3C500CT
designator C?  Capacitance: 3.3pF  (hidden comment: *)
Capacitor, Ceramic (MLCC), 3.3pF, 50V, NP0, SMD 0402; Manufacturer: Walsin Tech Corp; Manufacturer Part Number: 0402N3R3C500CT; Package Size: 0402; JLCPCB Basic Part: No; JLCPCB Part Number: C314280; Supplier 1: LCSC; Category: Capacitors - MLCC; Supplier Part Number 1: C314280; Voltage Rating: 50V; Temperature Coefficient: NP0; RoHS: Yes; ComponentLink1Description: Datasheet; ComponentLink1URL: https://wmsc.lcsc.com/wmsc/upload/file/pdf/v2/lcsc/2304140030_Walsin-Tech-Corp-0402N3R3C500CT_C314280.pdf; ComponentLink2Description: JLCPCB Part URL; ComponentLink2URL: https://jlcpcb.com/partdetail/C314280; ComponentLink3Description: LCSC Part URL; ComponentLink3URL: https://lcsc.com/product-detail/Multilayer-Ceramic-Capacitors-MLCC---SMD-SMT_Walsin-Tech-Corp-Walsin-Tech-Corp-0402N3R3C500CT_C314280.html
footprint CAP-0402 (0402 (1005M) Capacitor)
pins: 1, 2

## 0402N3R6B500
designator C?  Capacitance: 3.6pF  (hidden comment: *)
Capacitor, Ceramic (MLCC), 3.6pF, 50V, NP0, SMD 0402; Manufacturer: Walsin Tech Corp; Manufacturer Part Number: 0402N3R6B500; Package Size: 0402; JLCPCB Basic Part: No; JLCPCB Part Number: C123485; Supplier 1: LCSC; Category: Capacitors - MLCC; Supplier Part Number 1: C123485; Voltage Rating: 50V; Temperature Coefficient: NP0; RoHS: Yes; ComponentLink1Description: Datasheet; ComponentLink1URL: https://wmsc.lcsc.com/wmsc/upload/file/pdf/v2/lcsc/2304140030_Walsin-Tech-Corp-0402N3R6B500_C123485.pdf; ComponentLink2Description: JLCPCB Part URL; ComponentLink2URL: https://jlcpcb.com/partdetail/C123485; ComponentLink3Description: LCSC Part URL; ComponentLink3URL: https://lcsc.com/product-detail/Multilayer-Ceramic-Capacitors-MLCC---SMD-SMT_Walsin-Tech-Corp-Walsin-Tech-Corp-0402N3R6B500_C123485.html
footprint CAP-0402 (0402 (1005M) Capacitor)
pins: 1, 2

## 0402N3R6C500CT
designator C?  Capacitance: 3.6pF  (hidden comment: *)
Capacitor, Ceramic (MLCC), 3.6pF, 50V, NP0, SMD 0402; Manufacturer: Walsin Tech Corp; Manufacturer Part Number: 0402N3R6C500CT; Package Size: 0402; JLCPCB Basic Part: No; JLCPCB Part Number: C295982; Supplier 1: LCSC; Category: Capacitors - MLCC; Supplier Part Number 1: C295982; Voltage Rating: 50V; Temperature Coefficient: NP0; RoHS: Yes; ComponentLink1Description: Datasheet; ComponentLink1URL: https://wmsc.lcsc.com/wmsc/upload/file/pdf/v2/lcsc/2304140030_Walsin-Tech-Corp-0402N3R6C500CT_C295982.pdf; ComponentLink2Description: JLCPCB Part URL; ComponentLink2URL: https://jlcpcb.com/partdetail/C295982; ComponentLink3Description: LCSC Part URL; ComponentLink3URL: https://lcsc.com/product-detail/Multilayer-Ceramic-Capacitors-MLCC---SMD-SMT_Walsin-Tech-Corp-Walsin-Tech-Corp-0402N3R6C500CT_C295982.html
footprint CAP-0402 (0402 (1005M) Capacitor)
pins: 1, 2

## 0402N3R9C500CT
designator C?  Capacitance: 3.9pF  (hidden comment: *)
Capacitor, Ceramic (MLCC), 3.9pF, 50V, NP0, SMD 0402; Manufacturer: Walsin Tech Corp; Manufacturer Part Number: 0402N3R9C500CT; Package Size: 0402; JLCPCB Basic Part: No; JLCPCB Part Number: C338136; Supplier 1: LCSC; Category: Capacitors - MLCC; Supplier Part Number 1: C338136; Voltage Rating: 50V; Temperature Coefficient: NP0; RoHS: Yes; ComponentLink1Description: Datasheet; ComponentLink1URL: https://wmsc.lcsc.com/wmsc/upload/file/pdf/v2/lcsc/2304140030_Walsin-Tech-Corp-0402N3R9C500CT_C338136.pdf; ComponentLink2Description: JLCPCB Part URL; ComponentLink2URL: https://jlcpcb.com/partdetail/C338136; ComponentLink3Description: LCSC Part URL; ComponentLink3URL: https://lcsc.com/product-detail/Multilayer-Ceramic-Capacitors-MLCC---SMD-SMT_Walsin-Tech-Corp-Walsin-Tech-Corp-0402N3R9C500CT_C338136.html
footprint CAP-0402 (0402 (1005M) Capacitor)
pins: 1, 2

## 0402N4R0B500CT
designator C?  Capacitance: 4pF  (hidden comment: *)
Capacitor, Ceramic (MLCC), 4pF, 50V, NP0, SMD 0402; Manufacturer: Walsin Tech Corp; Manufacturer Part Number: 0402N4R0B500CT; Package Size: 0402; JLCPCB Basic Part: No; JLCPCB Part Number: C458866; Supplier 1: LCSC; Category: Capacitors - MLCC; Supplier Part Number 1: C458866; Voltage Rating: 50V; Temperature Coefficient: NP0; RoHS: Yes; ComponentLink1Description: Datasheet; ComponentLink1URL: https://wmsc.lcsc.com/wmsc/upload/file/pdf/v2/lcsc/2304140030_Walsin-Tech-Corp-0402N4R0B500CT_C458866.pdf; ComponentLink2Description: JLCPCB Part URL; ComponentLink2URL: https://jlcpcb.com/partdetail/C458866; ComponentLink3Description: LCSC Part URL; ComponentLink3URL: https://lcsc.com/product-detail/Multilayer-Ceramic-Capacitors-MLCC---SMD-SMT_Walsin-Tech-Corp-Walsin-Tech-Corp-0402N4R0B500CT_C458866.html
footprint CAP-0402 (0402 (1005M) Capacitor)
pins: 1, 2

## 0402N4R0C500CT
designator C?  Capacitance: 4pF  (hidden comment: *)
Capacitor, Ceramic (MLCC), 4pF, 50V, NP0, SMD 0402; Manufacturer: Walsin Tech Corp; Manufacturer Part Number: 0402N4R0C500CT; Package Size: 0402; JLCPCB Basic Part: No; JLCPCB Part Number: C314298; Supplier 1: LCSC; Category: Capacitors - MLCC; Supplier Part Number 1: C314298; Voltage Rating: 50V; Temperature Coefficient: NP0; RoHS: Yes; ComponentLink1Description: Datasheet; ComponentLink1URL: https://wmsc.lcsc.com/wmsc/upload/file/pdf/v2/lcsc/2304140030_Walsin-Tech-Corp-0402N4R0C500CT_C314298.pdf; ComponentLink2Description: JLCPCB Part URL; ComponentLink2URL: https://jlcpcb.com/partdetail/C314298; ComponentLink3Description: LCSC Part URL; ComponentLink3URL: https://lcsc.com/product-detail/Multilayer-Ceramic-Capacitors-MLCC---SMD-SMT_Walsin-Tech-Corp-Walsin-Tech-Corp-0402N4R0C500CT_C314298.html
footprint CAP-0402 (0402 (1005M) Capacitor)
pins: 1, 2

## 0402N4R3B500CT
designator C?  Capacitance: 4.3pF  (hidden comment: *)
Capacitor, Ceramic (MLCC), 4.3pF, 50V, NP0, SMD 0402; Manufacturer: Walsin Tech Corp; Manufacturer Part Number: 0402N4R3B500CT; Package Size: 0402; JLCPCB Basic Part: No; JLCPCB Part Number: C469635; Supplier 1: LCSC; Category: Capacitors - MLCC; Supplier Part Number 1: C469635; Voltage Rating: 50V; Temperature Coefficient: NP0; RoHS: Yes; ComponentLink1Description: Datasheet; ComponentLink1URL: https://wmsc.lcsc.com/wmsc/upload/file/pdf/v2/lcsc/2304140030_Walsin-Tech-Corp-0402N4R3B500CT_C469635.pdf; ComponentLink2Description: JLCPCB Part URL; ComponentLink2URL: https://jlcpcb.com/partdetail/C469635; ComponentLink3Description: LCSC Part URL; ComponentLink3URL: https://lcsc.com/product-detail/Multilayer-Ceramic-Capacitors-MLCC---SMD-SMT_Walsin-Tech-Corp-Walsin-Tech-Corp-0402N4R3B500CT_C469635.html
footprint CAP-0402 (0402 (1005M) Capacitor)
pins: 1, 2

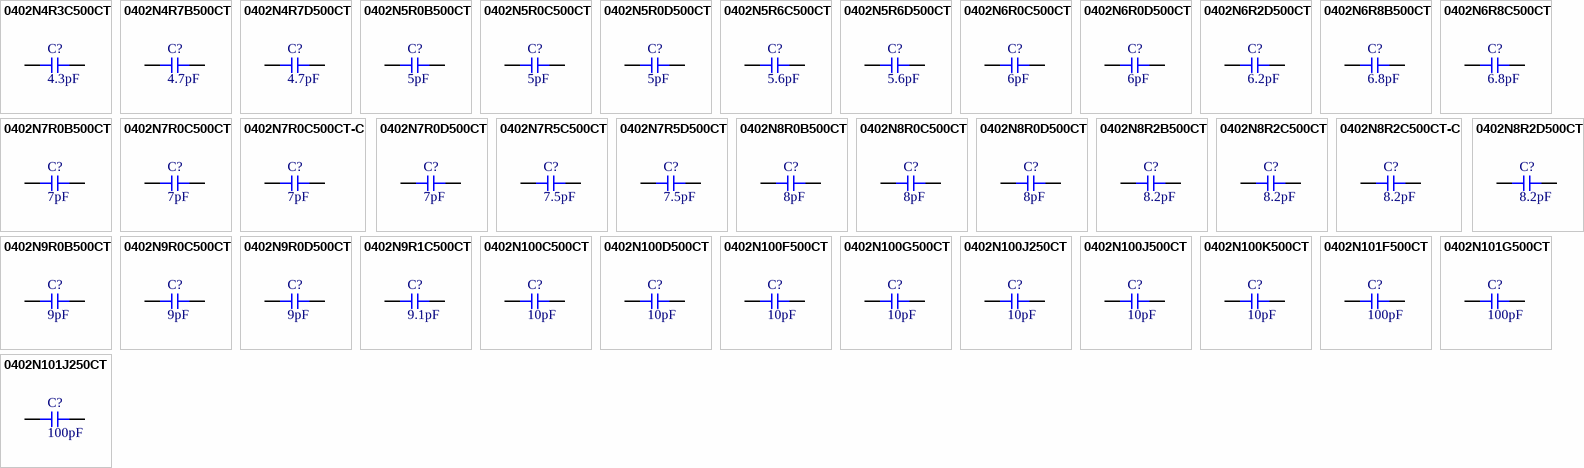
[diagram p10: symbols 0402N4R3C500CT to 0402N101J250CT]
